# Altium footprint library ICS.PcbLib: 74 footprints (part 1 of 5)
Each footprint in its own frame and in the unit in brackets; x right, y up, seen from the top. Pads: shape width x height; smd on the part's side, far side on the other; paste and mask are expansions set on the pad; w line width, h text height; cw(c..) or ccw(c..) is an arc to the next point about the centre after c.
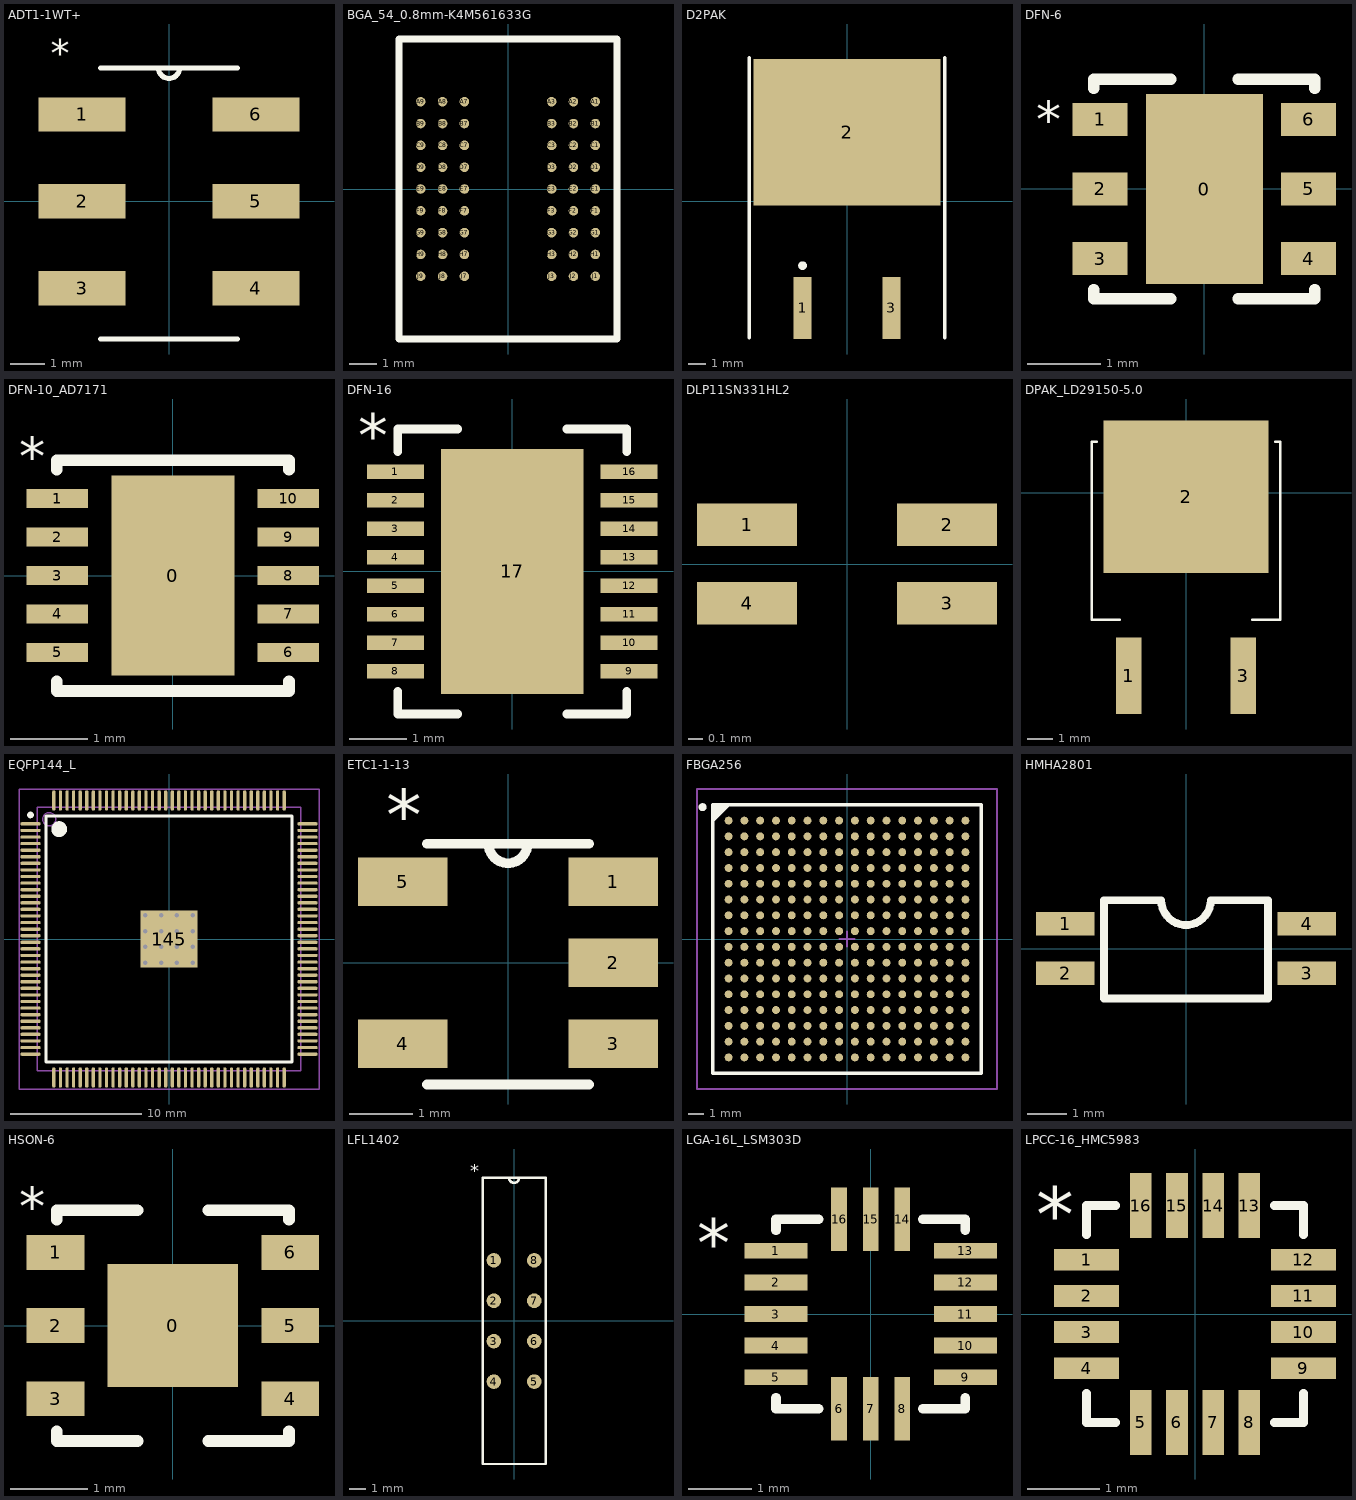
[diagram p0: the footprints below, top view; thin cyan lines are the x and y axes]

## ADT1-1WT+ [mm]
pads (6):
  rect 2.54x1 smd: 1(-2.54,2.54) 2(-2.54,0) 3(-2.54,-2.54) 4(2.54,-2.54) 5(2.54,0) 6(2.54,2.54)
Top Overlay:
  lines w0.152: -1.994,-4.026 1.994,-4.026 ; -1.994,3.899 1.994,3.899 ; -0.305,3.899 ccw(c0,3.899) 0.305,3.899
  text "*" at -3.455,3.935 h0.81
3D body: height 2.88, standoff 0.02, extent -3.455,-3.935 3.455,3.935

## BGA_54_0.8mm-K4M561633G [mm]
pads (54):
  round 0.35 smd: A1(3.2,3.2) A2(2.4,3.2) A3(1.6,3.2) A7(-1.6,3.2) A8(-2.4,3.2) A9(-3.2,3.2) B1(3.2,2.4) B2(2.4,2.4) B3(1.6,2.4) B7(-1.6,2.4) B8(-2.4,2.4) B9(-3.2,2.4) C1(3.2,1.6) C2(2.4,1.6) C3(1.6,1.6) C7(-1.6,1.6) C8(-2.4,1.6) C9(-3.2,1.6) D1(3.2,0.8) D2(2.4,0.8) D3(1.6,0.8) D7(-1.6,0.8) D8(-2.4,0.8) D9(-3.2,0.8) E1(3.2,0) E2(2.4,0) E3(1.6,0) E7(-1.6,0) E8(-2.4,0) E9(-3.2,0) F1(3.2,-0.8) F2(2.4,-0.8) F3(1.6,-0.8) F7(-1.6,-0.8) F8(-2.4,-0.8) F9(-3.2,-0.8) G1(3.2,-1.6) G2(2.4,-1.6) G3(1.6,-1.6) G7(-1.6,-1.6) G8(-2.4,-1.6) G9(-3.2,-1.6) H1(3.2,-2.4) H2(2.4,-2.4) H3(1.6,-2.4) H7(-1.6,-2.4) H8(-2.4,-2.4) H9(-3.2,-2.4) J1(3.2,-3.2) J2(2.4,-3.2) J3(1.6,-3.2) J7(-1.6,-3.2) J8(-2.4,-3.2) J9(-3.2,-3.2)
Top Overlay:
  lines w0.254: -4,-5.5 -4,5.5 4,5.5 4,-5.5 -4,-5.5
3D body: height 1.17, standoff 0.02, extent -4,-5.5 4,5.5

## D2PAK [mil]
pads (3):
  rect 41.34x140 smd: 1(-100,-240) 3(100,-240)
  rect 420x330 smd: 2(0,155)
Top Overlay:
  circle w9.84: c-99.92,-145 r4.92
  lines w7.87: -219.49,-306.97 -219.49,322.95 ; 219.49,-306.97 219.49,322.95

## DFN-6 [mm]
pads (7):
  rect 1.6x2.6 smd: 0(0,0)
  rect 0.75x0.45 smd: 1(-1.425,0.95) 2(-1.425,0) 3(-1.425,-0.95) 4(1.425,-0.95) 5(1.425,0) 6(1.425,0.95)
Top Overlay:
  lines w0.152: -1.51,-1.375 -1.51,-1.5 -0.459,-1.5 ; -1.51,1.375 -1.51,1.5 -0.459,1.5 ; 0.459,-1.5 1.51,-1.5 1.51,-1.375 ; 0.459,1.5 1.51,1.5 1.51,1.375
  text "*" at -2.3,0.7 h0.5
3D body: height 0.94, standoff 0.02, extent -1.51,-1.5 1.51,1.5

## DFN-10_AD7171 [mm]
pads (11):
  rect 1.6x2.6 smd: 0(0,0)
  rect 0.8x0.25 smd: 1(-1.5,1) 2(-1.5,0.5) 3(-1.5,0) 4(-1.5,-0.5) 5(-1.5,-1) 6(1.5,-1) 7(1.5,-0.5) 8(1.5,0) 9(1.5,0.5) 10(1.5,1)
Top Overlay:
  lines w0.152: -1.51,-1.375 -1.51,-1.5 1.51,-1.5 1.51,-1.375 ; -1.51,1.375 -1.51,1.5 1.51,1.5 1.51,1.375
  text "*" at -2,1.3 h0.5
3D body: height 0.79, standoff 0.02, extent -1.51,-1.5 1.51,1.5

## DFN-16 [mm]
pads (17):
  rect 1x0.25 smd: 1(-2.05,1.75) 2(-2.05,1.25) 3(-2.05,0.75) 4(-2.05,0.25) 5(-2.05,-0.25) 6(-2.05,-0.75) 7(-2.05,-1.25) 8(-2.05,-1.75) 9(2.05,-1.75) 10(2.05,-1.25) 11(2.05,-0.75) 12(2.05,-0.25) 13(2.05,0.25) 14(2.05,0.75) 15(2.05,1.25) 16(2.05,1.75)
  rect 2.5x4.3 smd: 17(0,0)
Top Overlay:
  lines w0.152: -2.01,-2.1 -2.01,-2.5 -0.959,-2.5 ; -2.01,2.1 -2.01,2.5 -0.959,2.5 ; 0.959,-2.5 2.01,-2.5 2.01,-2.1 ; 0.959,2.5 2.01,2.5 2.01,2.1
  text "*" at -2.7,2 h0.76
3D body: height 0.79, standoff 0.02, extent -2.01,-2.5 2.01,2.5

## DLP11SN331HL2 [mm]
pads (4):
  rect 0.7x0.3 smd: 1(-0.7,0.275) 2(0.7,0.275) 3(0.7,-0.275) 4(-0.7,-0.275)
3D body: height 0.85, standoff 0.01, extent -0.635,-0.5 0.635,0.5

## DPAK_LD29150-5.0 [mm]
pads (3):
  rect 1x3 smd: 1(-2.25,-7.196) 3(2.25,-7.196)
  rect 6.5x6 smd: 2(0,-0.163)
Top Overlay:
  lines w0.1: -3.5,2 -3.7,2 -3.7,-5 -2.6,-5 ; 2.6,-5 3.7,-5 3.7,2 3.5,2
3D body: height 2.32, standoff 0.02, extent -3.25,-7.95 3.25,2.05

## EQFP144_L [mm] "Thin QFP, 144-Leads, Body 20x20mm, Pitch 0.5mm, IPC High Density"
height 1.6
pads (145):
  oval 1.55x0.25 smd: 1(-10.525,8.75) 2(-10.525,8.25) 3(-10.525,7.75) 4(-10.525,7.25) 5(-10.525,6.75) 6(-10.525,6.25) 7(-10.525,5.75) 8(-10.525,5.25) 9(-10.525,4.75) 10(-10.525,4.25) 11(-10.525,3.75) 12(-10.525,3.25) 13(-10.525,2.75) 14(-10.525,2.25) 15(-10.525,1.75) 16(-10.525,1.25) 17(-10.525,0.75) 18(-10.525,0.25) 19(-10.525,-0.25) 20(-10.525,-0.75) 21(-10.525,-1.25) 22(-10.525,-1.75) 23(-10.525,-2.25) 24(-10.525,-2.75) 25(-10.525,-3.25) 26(-10.525,-3.75) 27(-10.525,-4.25) 28(-10.525,-4.75) 29(-10.525,-5.25) 30(-10.525,-5.75) 31(-10.525,-6.25) 32(-10.525,-6.75) 33(-10.525,-7.25) 34(-10.525,-7.75) 35(-10.525,-8.25) 36(-10.525,-8.75) 73(10.525,-8.75) 74(10.525,-8.25) 75(10.525,-7.75) 76(10.525,-7.25) 77(10.525,-6.75) 78(10.525,-6.25) 79(10.525,-5.75) 80(10.525,-5.25) 81(10.525,-4.75) 82(10.525,-4.25) 83(10.525,-3.75) 84(10.525,-3.25) 85(10.525,-2.75) 86(10.525,-2.25) 87(10.525,-1.75) 88(10.525,-1.25) 89(10.525,-0.75) 90(10.525,-0.25) 91(10.525,0.25) 92(10.525,0.75) 93(10.525,1.25) 94(10.525,1.75) 95(10.525,2.25) 96(10.525,2.75) 97(10.525,3.25) 98(10.525,3.75) 99(10.525,4.25) 100(10.525,4.75) 101(10.525,5.25) 102(10.525,5.75) 103(10.525,6.25) 104(10.525,6.75) 105(10.525,7.25) 106(10.525,7.75) 107(10.525,8.25) 108(10.525,8.75)
  oval 0.25x1.55 smd: 37(-8.75,-10.525) 38(-8.25,-10.525) 39(-7.75,-10.525) 40(-7.25,-10.525) 41(-6.75,-10.525) 42(-6.25,-10.525) 43(-5.75,-10.525) 44(-5.25,-10.525) 45(-4.75,-10.525) 46(-4.25,-10.525) 47(-3.75,-10.525) 48(-3.25,-10.525) 49(-2.75,-10.525) 50(-2.25,-10.525) 51(-1.75,-10.525) 52(-1.25,-10.525) 53(-0.75,-10.525) 54(-0.25,-10.525) 55(0.25,-10.525) 56(0.75,-10.525) 57(1.25,-10.525) 58(1.75,-10.525) 59(2.25,-10.525) 60(2.75,-10.525) 61(3.25,-10.525) 62(3.75,-10.525) 63(4.25,-10.525) 64(4.75,-10.525) 65(5.25,-10.525) 66(5.75,-10.525) 67(6.25,-10.525) 68(6.75,-10.525) 69(7.25,-10.525) 70(7.75,-10.525) 71(8.25,-10.525) 72(8.75,-10.525) 109(8.75,10.525) 110(8.25,10.525) 111(7.75,10.525) 112(7.25,10.525) 113(6.75,10.525) 114(6.25,10.525) 115(5.75,10.525) 116(5.25,10.525) 117(4.75,10.525) 118(4.25,10.525) 119(3.75,10.525) 120(3.25,10.525) 121(2.75,10.525) 122(2.25,10.525) 123(1.75,10.525) 124(1.25,10.525) 125(0.75,10.525) 126(0.25,10.525) 127(-0.25,10.525) 128(-0.75,10.525) 129(-1.25,10.525) 130(-1.75,10.525) 131(-2.25,10.525) 132(-2.75,10.525) 133(-3.25,10.525) 134(-3.75,10.525) 135(-4.25,10.525) 136(-4.75,10.525) 137(-5.25,10.525) 138(-5.75,10.525) 139(-6.25,10.525) 140(-6.75,10.525) 141(-7.25,10.525) 142(-7.75,10.525) 143(-8.25,10.525) 144(-8.75,10.525)
  rect 4.3x4.3 smd: 145(0,0)
via -1.8,1.8 diameter 0.66 hole 0.33
via -0.6,1.8 diameter 0.66 hole 0.33
via 0.6,1.8 diameter 0.66 hole 0.33
via 1.8,1.8 diameter 0.66 hole 0.33
via -1.8,0.6 diameter 0.66 hole 0.33
via -0.6,0.6 diameter 0.66 hole 0.33
via 0.6,0.6 diameter 0.66 hole 0.33
via 1.8,0.6 diameter 0.66 hole 0.33
via -1.8,-0.6 diameter 0.66 hole 0.33
via -0.6,-0.6 diameter 0.66 hole 0.33
via 0.6,-0.6 diameter 0.66 hole 0.33
via 1.8,-0.6 diameter 0.66 hole 0.33
via -1.8,-1.8 diameter 0.66 hole 0.33
via -0.6,-1.8 diameter 0.66 hole 0.33
via 0.6,-1.8 diameter 0.66 hole 0.33
via 1.8,-1.8 diameter 0.66 hole 0.33
Top Overlay:
  circle w0.25: c-10.525,9.425 r0.125
  circle w0.6: c-8.35,8.35 r0.3
  lines w0.2: -9.35,-9.35 -9.35,9.35 9.35,9.35 9.35,-9.35 -9.35,-9.35
Mechanical 13:
  circle w0.1: c-9.1,9.1 r0.5
  lines w0.1: -10,-10 -10,10 10,10 10,-10 -10,-10
Mechanical 15:
  lines w0.1: -0.5,0 0.5,0 ; 0,-0.5 0,0.5 ; -11.4,-11.4 -11.4,11.4 11.4,11.4 11.4,-11.4 -11.4,-11.4
3D body: height 1.6, standoff 0, extent -10,-10 10,10

## ETC1-1-13 [mm]
pads (5):
  rect 1.4x0.76 smd: 1(1.651,1.27) 2(1.651,0) 3(1.651,-1.27) 4(-1.651,-1.27) 5(-1.651,1.27)
Top Overlay:
  lines w0.152: -1.27,-1.905 1.27,-1.905 ; -1.27,1.867 1.27,1.867 ; -0.305,1.867 ccw(c0,1.867) 0.305,1.867
  text "*" at -1.905,1.905 h0.81
3D body: height 3.84, standoff 0.02, extent -1.905,-1.905 1.905,1.905

## FBGA256 [mm] "BGA, 256-Leads, Body 17x17mm, Pitch 1mm"
height 2.2
pads (256):
  round 0.5 smd: A1(-7.5,7.5) A2(-6.5,7.5) A3(-5.5,7.5) A4(-4.5,7.5) A5(-3.5,7.5) A6(-2.5,7.5) A7(-1.5,7.5) A8(-0.5,7.5) A9(0.5,7.5) A10(1.5,7.5) A11(2.5,7.5) A12(3.5,7.5) A13(4.5,7.5) A14(5.5,7.5) A15(6.5,7.5) A16(7.5,7.5) B1(-7.5,6.5) B2(-6.5,6.5) B3(-5.5,6.5) B4(-4.5,6.5) B5(-3.5,6.5) B6(-2.5,6.5) B7(-1.5,6.5) B8(-0.5,6.5) B9(0.5,6.5) B10(1.5,6.5) B11(2.5,6.5) B12(3.5,6.5) B13(4.5,6.5) B14(5.5,6.5) B15(6.5,6.5) B16(7.5,6.5) C1(-7.5,5.5) C2(-6.5,5.5) C3(-5.5,5.5) C4(-4.5,5.5) C5(-3.5,5.5) C6(-2.5,5.5) C7(-1.5,5.5) C8(-0.5,5.5) C9(0.5,5.5) C10(1.5,5.5) C11(2.5,5.5) C12(3.5,5.5) C13(4.5,5.5) C14(5.5,5.5) C15(6.5,5.5) C16(7.5,5.5) D1(-7.5,4.5) D2(-6.5,4.5) D3(-5.5,4.5) D4(-4.5,4.5) D5(-3.5,4.5) D6(-2.5,4.5) D7(-1.5,4.5) D8(-0.5,4.5) D9(0.5,4.5) D10(1.5,4.5) D11(2.5,4.5) D12(3.5,4.5) D13(4.5,4.5) D14(5.5,4.5) D15(6.5,4.5) D16(7.5,4.5) E1(-7.5,3.5) E2(-6.5,3.5) E3(-5.5,3.5) E4(-4.5,3.5) E5(-3.5,3.5) E6(-2.5,3.5) E7(-1.5,3.5) E8(-0.5,3.5) E9(0.5,3.5) E10(1.5,3.5) E11(2.5,3.5) E12(3.5,3.5) E13(4.5,3.5) E14(5.5,3.5) E15(6.5,3.5) E16(7.5,3.5) F1(-7.5,2.5) F2(-6.5,2.5) F3(-5.5,2.5) F4(-4.5,2.5) F5(-3.5,2.5) F6(-2.5,2.5) F7(-1.5,2.5) F8(-0.5,2.5) F9(0.5,2.5) F10(1.5,2.5) F11(2.5,2.5) F12(3.5,2.5) F13(4.5,2.5) F14(5.5,2.5) F15(6.5,2.5) F16(7.5,2.5) G1(-7.5,1.5) G2(-6.5,1.5) G3(-5.5,1.5) G4(-4.5,1.5) G5(-3.5,1.5) G6(-2.5,1.5) G7(-1.5,1.5) G8(-0.5,1.5) G9(0.5,1.5) G10(1.5,1.5) G11(2.5,1.5) G12(3.5,1.5) G13(4.5,1.5) G14(5.5,1.5) G15(6.5,1.5) G16(7.5,1.5) H1(-7.5,0.5) H2(-6.5,0.5) H3(-5.5,0.5) H4(-4.5,0.5) H5(-3.5,0.5) H6(-2.5,0.5) H7(-1.5,0.5) H8(-0.5,0.5) H9(0.5,0.5) H10(1.5,0.5) H11(2.5,0.5) H12(3.5,0.5) H13(4.5,0.5) H14(5.5,0.5) H15(6.5,0.5) H16(7.5,0.5) J1(-7.5,-0.5) J2(-6.5,-0.5) J3(-5.5,-0.5) J4(-4.5,-0.5) J5(-3.5,-0.5) J6(-2.5,-0.5) J7(-1.5,-0.5) J8(-0.5,-0.5) J9(0.5,-0.5) J10(1.5,-0.5) J11(2.5,-0.5) J12(3.5,-0.5) J13(4.5,-0.5) J14(5.5,-0.5) J15(6.5,-0.5) J16(7.5,-0.5) K1(-7.5,-1.5) K2(-6.5,-1.5) K3(-5.5,-1.5) K4(-4.5,-1.5) K5(-3.5,-1.5) K6(-2.5,-1.5) K7(-1.5,-1.5) K8(-0.5,-1.5) K9(0.5,-1.5) K10(1.5,-1.5) K11(2.5,-1.5) K12(3.5,-1.5) K13(4.5,-1.5) K14(5.5,-1.5) K15(6.5,-1.5) K16(7.5,-1.5) L1(-7.5,-2.5) L2(-6.5,-2.5) L3(-5.5,-2.5) L4(-4.5,-2.5) L5(-3.5,-2.5) L6(-2.5,-2.5) L7(-1.5,-2.5) L8(-0.5,-2.5) L9(0.5,-2.5) L10(1.5,-2.5) L11(2.5,-2.5) L12(3.5,-2.5) L13(4.5,-2.5) L14(5.5,-2.5) L15(6.5,-2.5) L16(7.5,-2.5) M1(-7.5,-3.5) M2(-6.5,-3.5) M3(-5.5,-3.5) M4(-4.5,-3.5) M5(-3.5,-3.5) M6(-2.5,-3.5) M7(-1.5,-3.5) M8(-0.5,-3.5) M9(0.5,-3.5) M10(1.5,-3.5) M11(2.5,-3.5) M12(3.5,-3.5) M13(4.5,-3.5) M14(5.5,-3.5) M15(6.5,-3.5) M16(7.5,-3.5) N1(-7.5,-4.5) N2(-6.5,-4.5) N3(-5.5,-4.5) N4(-4.5,-4.5) N5(-3.5,-4.5) N6(-2.5,-4.5) N7(-1.5,-4.5) N8(-0.5,-4.5) N9(0.5,-4.5) N10(1.5,-4.5) N11(2.5,-4.5) N12(3.5,-4.5) N13(4.5,-4.5) N14(5.5,-4.5) N15(6.5,-4.5) N16(7.5,-4.5) P1(-7.5,-5.5) P2(-6.5,-5.5) P3(-5.5,-5.5) P4(-4.5,-5.5) P5(-3.5,-5.5) P6(-2.5,-5.5) P7(-1.5,-5.5) P8(-0.5,-5.5) P9(0.5,-5.5) P10(1.5,-5.5) P11(2.5,-5.5) P12(3.5,-5.5) P13(4.5,-5.5) P14(5.5,-5.5) P15(6.5,-5.5) P16(7.5,-5.5) R1(-7.5,-6.5) R2(-6.5,-6.5) R3(-5.5,-6.5) R4(-4.5,-6.5) R5(-3.5,-6.5) R6(-2.5,-6.5) R7(-1.5,-6.5) R8(-0.5,-6.5) R9(0.5,-6.5) R10(1.5,-6.5) R11(2.5,-6.5) R12(3.5,-6.5) R13(4.5,-6.5) R14(5.5,-6.5) R15(6.5,-6.5) R16(7.5,-6.5) T1(-7.5,-7.5) T2(-6.5,-7.5) T3(-5.5,-7.5) T4(-4.5,-7.5) T5(-3.5,-7.5) T6(-2.5,-7.5) T7(-1.5,-7.5) T8(-0.5,-7.5) T9(0.5,-7.5) T10(1.5,-7.5) T11(2.5,-7.5) T12(3.5,-7.5) T13(4.5,-7.5) T14(5.5,-7.5) T15(6.5,-7.5) T16(7.5,-7.5)
Top Overlay:
  circle w0.25: c-9.15,8.35 r0.125
  region: -7.5,8.5 -8.5,7.5 -8.5,8.5
  lines w0.2: -8.5,7.5 -7.5,8.5 ; -8.5,-8.5 8.5,-8.5 8.5,8.5 -8.5,8.5 -8.5,-8.5
Mechanical 13:
  lines w0.1: -8.5,-8.5 8.5,-8.5 8.5,8.5 -8.5,8.5 -8.5,-8.5
Mechanical 15:
  lines w0.1: -0.5,0 0.5,0 ; 0,-0.5 0,0.5 ; -9.5,-9.5 9.5,-9.5 9.5,9.5 -9.5,9.5 -9.5,-9.5
3D body: height 2.2, standoff 0, extent -8.5,-8.5 8.5,8.5

## HMHA2801 [mm]
height 1.2
pads (4):
  rect 1.5x0.6 smd: 1(-3.1,0.635) 2(-3.1,-0.635) 3(3.1,-0.635) 4(3.1,0.635)
Top Overlay:
  lines w0.203: -2.1,-1.286 -2.1,1.24 -0.635,1.24 ccw(c0,1.24) 0.635,1.24 2.1,1.24 2.1,-1.286 -2.1,-1.286
3D body: height 2.3, standoff 0.01, extent -3.397,-1.25 3.398,1.25

## HSON-6 [mm]
pads (7):
  rect 1.7x1.6 smd: 0(0,0)
  rect 0.75x0.45 smd: 1(-1.525,0.95) 2(-1.525,0) 3(-1.525,-0.95) 4(1.525,-0.95) 5(1.525,0) 6(1.525,0.95)
Top Overlay:
  lines w0.152: -1.51,-1.375 -1.51,-1.5 -0.459,-1.5 ; -1.51,1.375 -1.51,1.5 -0.459,1.5 ; 0.459,-1.5 1.51,-1.5 1.51,-1.375 ; 0.459,1.5 1.51,1.5 1.51,1.375
  text "*" at -2,1.3 h0.5
3D body: height 0.94, standoff 0.02, extent -1.5,-1.45 1.5,1.45

## LFL1402 [mm]
pads (8):
  round 0.9 smd: 1(-1.25,3.75) 2(-1.25,1.25) 3(-1.25,-1.25) 4(-1.25,-3.75) 5(1.25,-3.75) 6(1.25,-1.25) 7(1.25,1.25) 8(1.25,3.75)
Top Overlay:
  lines w0.152: -0.3,8.85 ccw(c0.005,8.85) 0.31,8.85 ; -1.95,-8.85 -1.95,8.85 1.95,8.85 1.95,-8.85 -1.95,-8.85
  text "*" at -2.7,8.9 h0.81

## LGA-16L_LSM303D [mm] "LGA-16L_LSM303D"
pads (16):
  rect 1x0.25 smd: 1(-1.5,1) 2(-1.5,0.5) 3(-1.5,0) 4(-1.5,-0.5) 5(-1.5,-1) 9(1.5,-1) 10(1.5,-0.5) 11(1.5,0) 12(1.5,0.5) 13(1.5,1)
  rect 0.25x1 smd: 6(-0.5,-1.5) 7(0,-1.5) 8(0.5,-1.5) 14(0.5,1.5) 15(0,1.5) 16(-0.5,1.5)
Top Overlay:
  lines w0.152: -1.5,-1.325 -1.5,-1.5 -0.825,-1.5 ; -1.5,1.325 -1.5,1.5 -0.825,1.5 ; 0.825,-1.5 1.5,-1.5 1.5,-1.325 ; 0.825,1.5 1.5,1.5 1.5,1.325
  text "*" at -2.75,0.75 h0.76
3D body: height 0.79, standoff 0.02, extent -1.5,-1.5 1.5,1.5

## LPCC-16_HMC5983 [mm] "LPCC-16_HMC5983"
pads (16):
  rect 0.9x0.3 smd: 1(-1.5,0.75) 2(-1.5,0.25) 3(-1.5,-0.25) 4(-1.5,-0.75) 9(1.5,-0.75) 10(1.5,-0.25) 11(1.5,0.25) 12(1.5,0.75)
  rect 0.3x0.9 smd: 5(-0.75,-1.5) 6(-0.25,-1.5) 7(0.25,-1.5) 8(0.75,-1.5) 13(0.75,1.5) 14(0.25,1.5) 15(-0.25,1.5) 16(-0.75,1.5)
Top Overlay:
  lines w0.127: -1.5,-1.1 -1.5,-1.5 -1.1,-1.5 ; -1.5,1.1 -1.5,1.5 -1.1,1.5 ; 1.1,-1.5 1.5,-1.5 1.5,-1.1 ; 1.1,1.5 1.5,1.5 1.5,1.1
  text "*" at -2.2,1 h0.76
3D body: height 0.94, standoff 0.02, extent -1.5,-1.5 1.5,1.5